# Altium footprint library MyPcbLib.PcbLib: 87 footprints (part 1 of 6)
Each footprint in its own frame and in the unit in brackets; x right, y up, seen from the top. Pads: shape width x height; smd on the part's side, far side on the other; paste and mask are expansions set on the pad; w line width, h text height; cw(c..) or ccw(c..) is an arc to the next point about the centre after c.
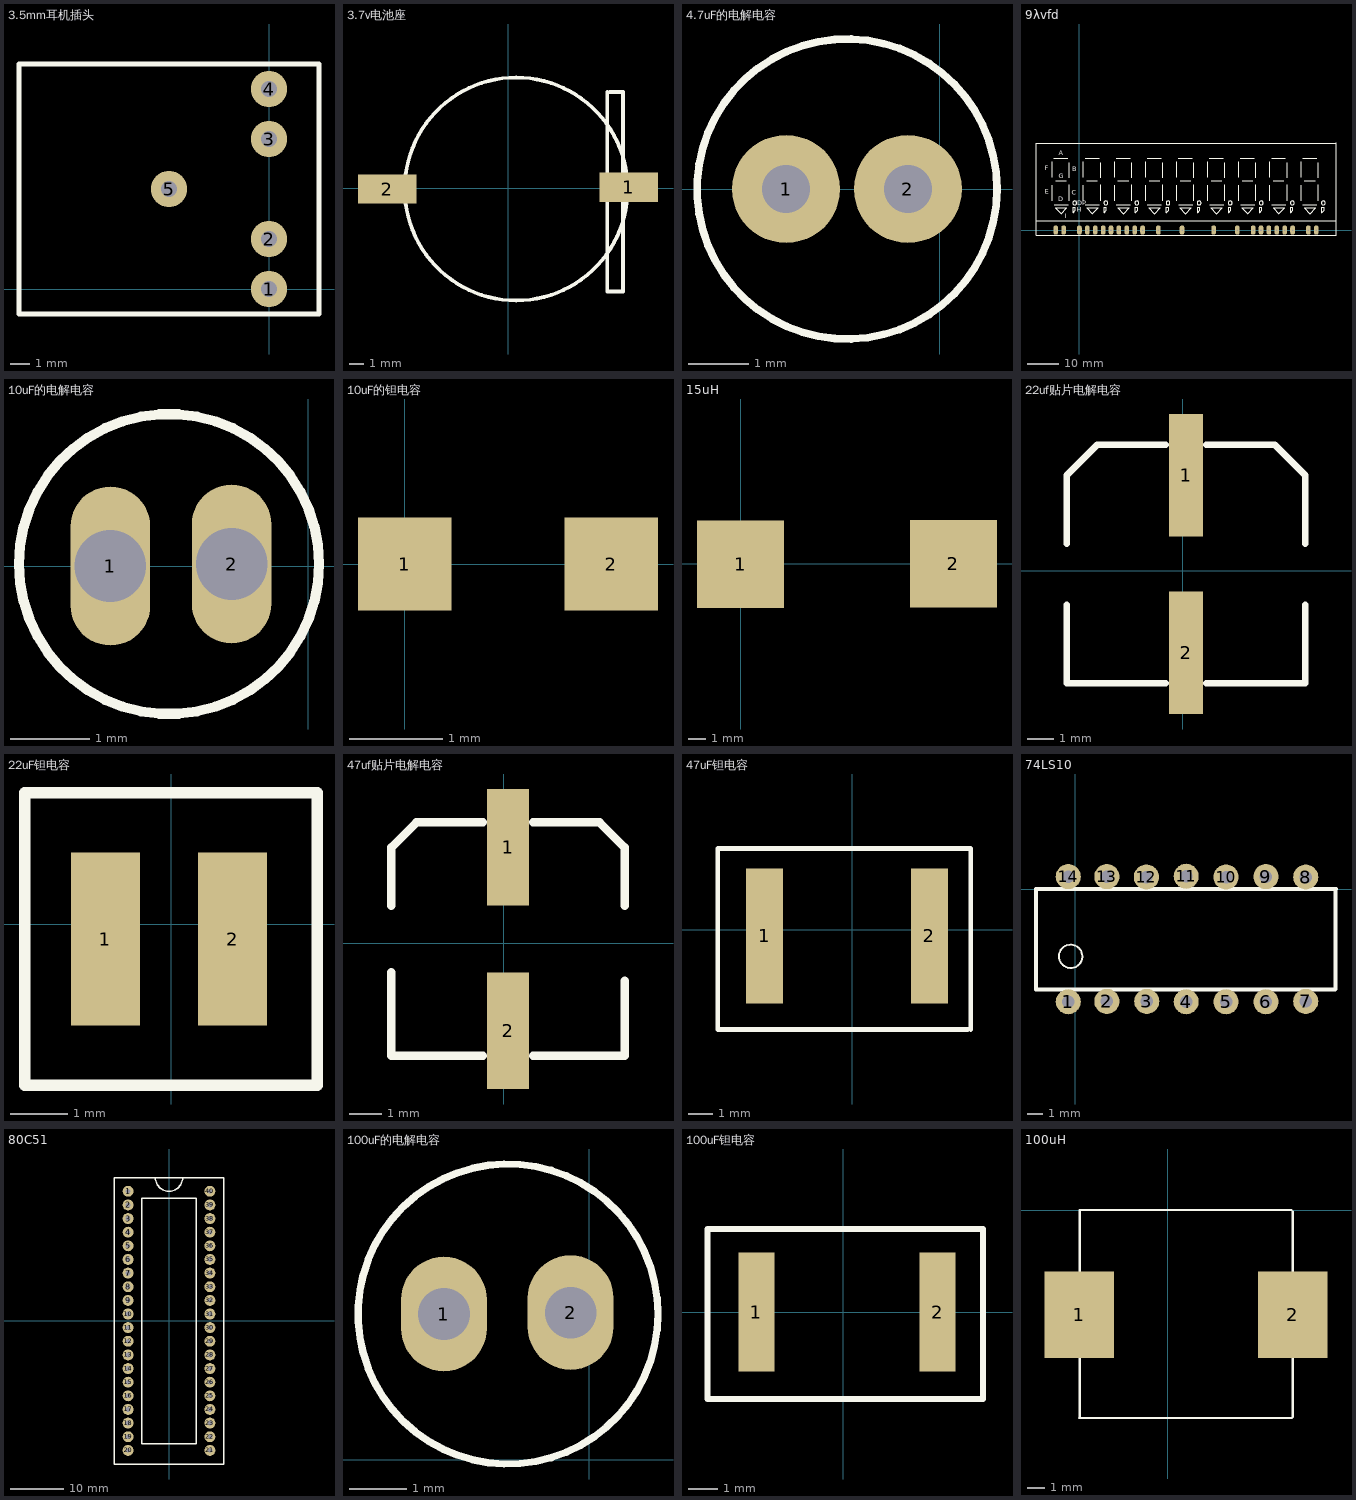
[diagram p0: the footprints below, top view; thin cyan lines are the x and y axes]

## 3.5mm耳机插头 [mm]
pads (5):
  round 1.85 hole 0.82: 1(0,0) 2(0,2.54) 3(0,7.62) 4(0,10.16) 5(-5.08,5.08)
Top Overlay:
  lines w0.254: -12.7,-1.27 -12.7,11.43 2.54,11.43 2.54,-1.27 -12.7,-1.27

## 3.7v电池座 [mm]
pads (2):
  rect 4x2 smd: 1(8.223,0.064) 2(-8.223,-0.064)
Top Overlay:
  circle w0.254: c0.56,-0.064 r7.6
  lines w0.254: 6.763,-7.048 6.763,6.54 ; 6.89,-7.048 7.779,-7.048 ; 6.953,6.54 7.842,6.54 7.842,-7.048

## 4.7uF的电解电容 [mm]
pads (2):
  round 1.8 hole 0.8: 1(-2.565,0) 2(-0.533,0)
Top Overlay:
  circle w0.127: c-1.549,0 r2.5

## 9λvfd [mm]
pads (23):
  oval 1.5x3 hole 0.5: 1(0,0) 2(2.54,0) 3(5.08,0) 4(7.62,0) 5(10.16,0) 6(12.7,0) 7(15.24,0) 8(17.78,0) 9(20.32,0) 10(25.4,0) 11(33.02,0) 12(43.18,0) 13(50.8,0) 14(55.88,0) 15(58.42,0) 16(60.96,0) 17(63.5,0) 18(66.04,0) 19(68.58,0) F1(-7.62,0) F1(-5.08,0) F2(73.66,0) F2(76.2,0)
Top Overlay:
  drawing of 151 lines, arcs and shapes, not listed
  text "D" at -6.8,9.2 h1.52
  text "H" at -0.8,5.9 h1.52
  text "I" at -4.8,3.8 h1.52
  text "DP" at -0.7,8 h1.52
  text "G" at -6.6,16.7 h1.52
  text "F" at -11.1,19.3 h1.52
  text "E" at -11.1,11.6 h1.52
  text "C" at -2.5,11.3 h1.52
  text "B" at -2.3,18.9 h1.52
  text "A" at -6.7,24 h1.52

## 10uF的电解电容 [mm]
pads (2):
  oval 1x2 hole 0.9: 1(-2.489,0) 2(-0.965,0.025)
Top Overlay:
  circle w0.127: c-1.753,0.025 r1.886

## 10uF的钽电容 [mm]
pads (2):
  rect 1x1 smd: 1(0,0) 2(2.21,0)

## 15uH [mm]
pads (2):
  rect 5x5 smd: 1(0,-0.025) 2(12.217,0)

## 22uf贴片电解电容 [mil]
pads (2):
  rect 50x180 smd: 1(5,140) 2(5,-120)
Top Overlay:
  lines w10: -170,-50 -170,-165 -25,-165 ; -170,40 -170,140 -125,185 -25,185 ; 35,-165 180,-165 180,-50 ; 35,185 135,185 180,140 180,40

## 22uF钽电容 [mil]
pads (2):
  rect 47.24x118.11 smd: 1(-45,-10) 2(42,-10)
Top Overlay:
  lines w7.87: -100,-110 100,-110 100,90 -100,90 -100,-110

## 47uf贴片电解电容 [mil] "7*7"
pads (2):
  rect 50x140 smd: 1(5,115) 2(5,-105)
Top Overlay:
  lines w10: -135,-35 -135,-135 -25,-135 ; -135,45 -135,115 -105,145 -25,145 ; 35,-135 145,-135 145,-45 ; 35,145 115,145 145,115 145,45

## 47uF钽电容 [mm]
pads (2):
  rect 1.5x5.5 smd: 1(-3.556,-0.254) 2(3.144,-0.254)
Top Overlay:
  lines w0.2: 4.699,-4.064 -5.461,-4.064 -5.461,3.302 -5.207,3.302 4.826,3.302 4.826,-4.064

## 74LS10 [mm]
pads (14):
  round 1.6 on Top hole 0.8: 1(-0.432,-7.163) 2(2.027,-7.137) 3(4.572,-7.137) 4(7.087,-7.163) 5(9.627,-7.163) 6(12.167,-7.163) 7(14.707,-7.137) 8(14.707,0.787) 9(12.167,0.813) 10(9.627,0.787) 11(7.087,0.838) 12(4.547,0.787) 13(2.027,0.813) 14(-0.432,0.813)
Top Overlay:
  lines w0.127: 0.466,-4.317 cw(c-0.279,-4.267) 0.468,-4.267
  lines w0.254: -2.489,-6.375 16.561,-6.375 ; -2.489,-6.299 -2.489,0.025 16.637,0.025 ; 16.612,-6.35 16.612,0

## 80C51 [mil]
pads (40):
  round 80 hole 35 unplated: 1(-300,950) 2(-300,850) 3(-300,750) 4(-300,650) 5(-300,550) 6(-300,450) 7(-300,350) 8(-300,250) 9(-300,150) 10(-300,50) 11(-300,-50) 12(-300,-150) 13(-300,-250) 14(-300,-350) 15(-300,-450) 16(-300,-550) 17(-300,-650) 18(-300,-750) 19(-300,-850) 20(-300,-950) 21(300,-950) 22(300,-850) 23(300,-750) 24(300,-650) 25(300,-550) 26(300,-450) 27(300,-350) 28(300,-250) 29(300,-150) 30(300,-50) 31(300,50) 32(300,150) 33(300,250) 34(300,350) 35(300,450) 36(300,550) 37(300,650) 38(300,750) 39(300,850) 40(300,950)
Top Overlay:
  lines w10: -100,1050 ccw(c0,1050) 100,1050 ; -400,-1050 400,-1050 400,1050 -400,1050 -400,-1050 ; -200,-900 -200,900 200,900 200,-900 -200,-900

## 100uF的电解电容 [mm]
pads (2):
  oval 1.5x2 hole 0.9: 1(-2.54,2.54) 2(-0.33,2.565)
Top Overlay:
  circle w0.127: c-1.422,2.54 r2.618

## 100uF钽电容 [mm]
pads (2):
  rect 1.2x4 smd: 1(-2.921,0) 2(3.175,0)
Top Overlay:
  lines w0.2: -4.572,-2.921 4.699,-2.921 4.699,2.794 -3.683,2.794 -4.572,2.794 -4.572,-2.921

## 100uH [mil]
pads (2):
  rect 157.48x196.85 smd: 1(-201,-238) 2(285,-238)
Top Overlay:
  lines w5: -201,-473 283,-473 ; -200,-472 -200,0 282,0 ; 285,-471 285,-3